# Altium footprint library 3D_MIG_Controller.PCBLIB: 560 footprints (part 28 of 35)
Each footprint in its own frame and in the unit in brackets; x right, y up, seen from the top. Pads: shape width x height; smd on the part's side, far side on the other; paste and mask are expansions set on the pad; w line width, h text height; cw(c..) or ccw(c..) is an arc to the next point about the centre after c.
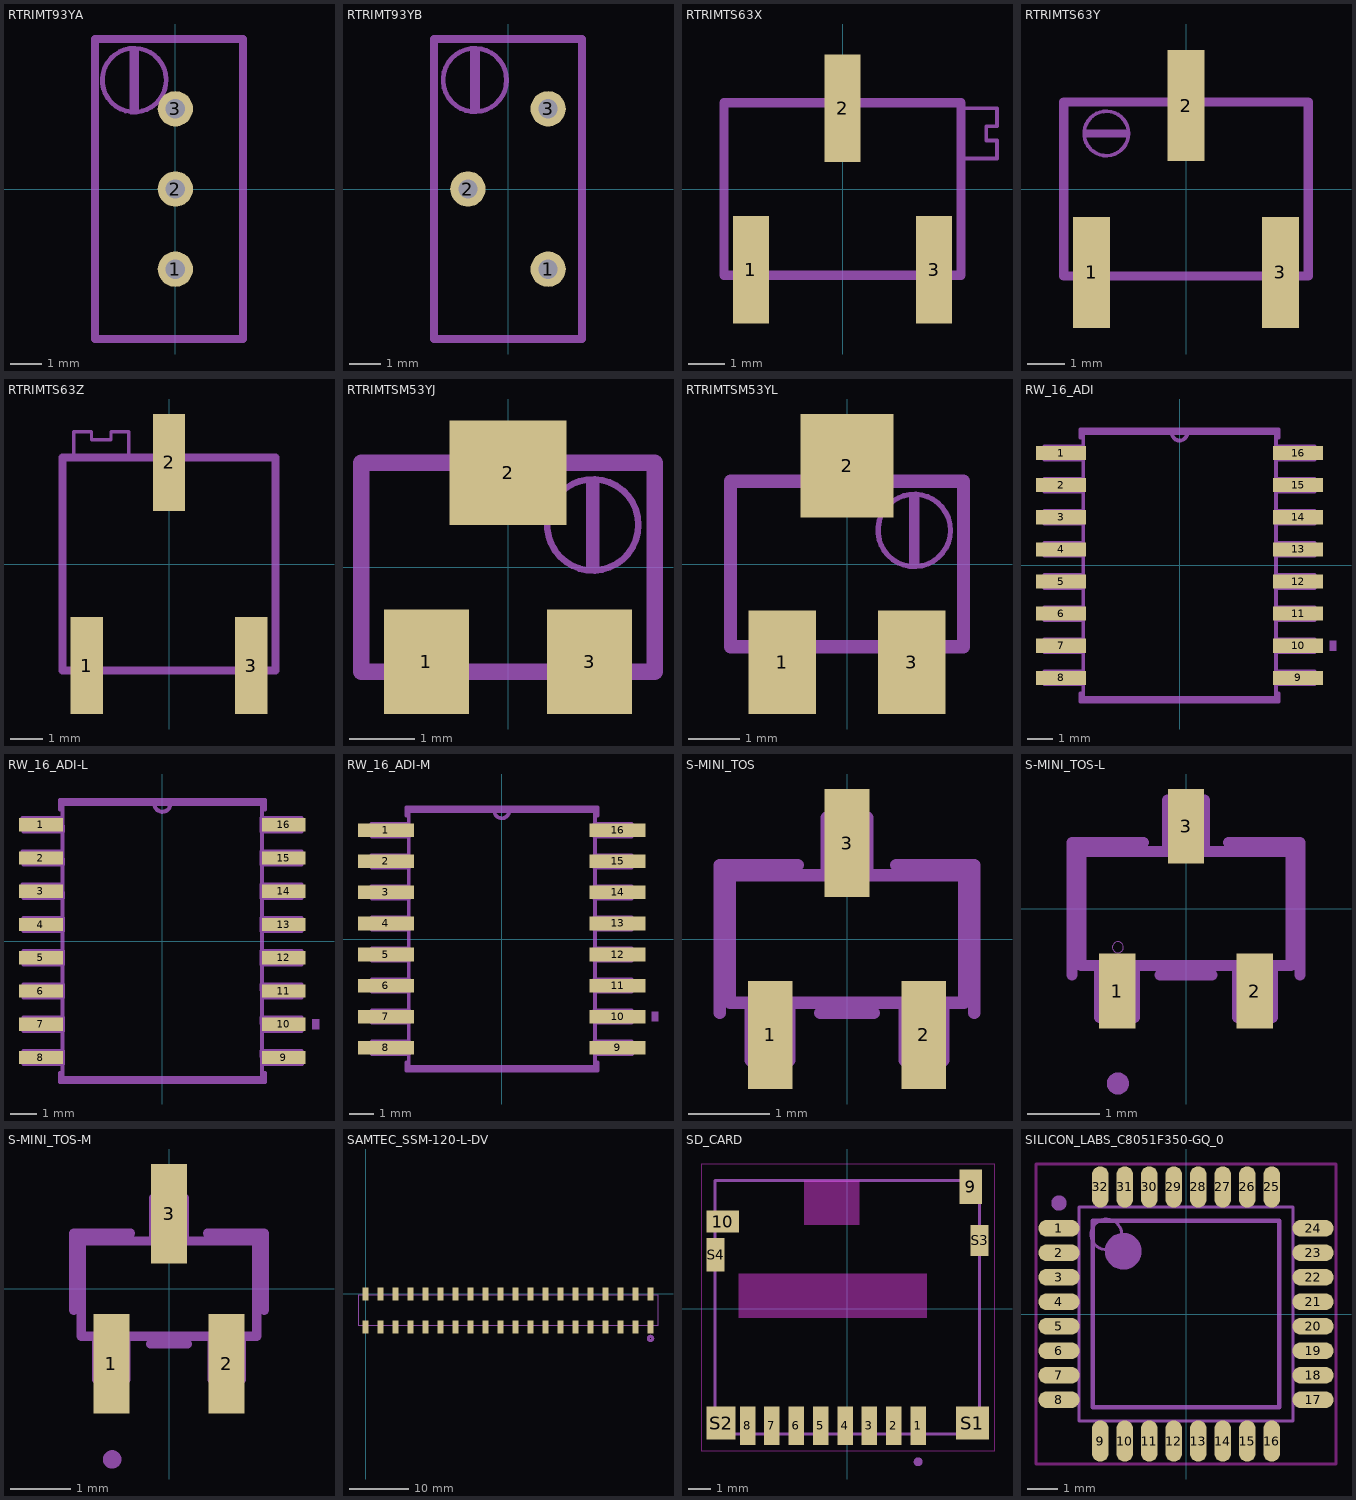
[diagram p27: the footprints below, top view; thin cyan lines are the x and y axes]

## RTRIMT93YA [mil]
pads (3):
  round 44 hole 24: 1(0,-100) 2(0,0) 3(0,100)
tDocu:
  lines w6: -29.53,102.36 ccw(c-51.18,135.76) -11.81,129.92
tPlace:
  region: -57.09,98.43 -57.09,173.23 -45.28,173.23 -45.28,98.43
  lines w6: -29.53,102.36 cw(c-51.18,135.76) -11.81,129.92
  lines w10: -100.39,-187.01 -100.39,187.01 84.65,187.01 84.65,-187.01 -100.39,-187.01

## RTRIMT93YB [mil]
pads (3):
  round 44 hole 24: 1(50,-100) 2(-50,0) 3(50,100)
tPlace:
  circle w6: c-41.34,135.83 r39.56
  region: -47.24,98.43 -47.24,173.23 -35.43,173.23 -35.43,98.43
  lines w10: -92.52,-187.01 -92.52,187.01 92.52,187.01 92.52,-187.01 -92.52,-187.01

## RTRIMTS63X [mm]
pads (3):
  rect 1x3 smd: 1(-2.55,-2.25) 2(0,2.25) 3(2.55,-2.25)
tDocu:
  region: -0.25,2.5 -0.25,3.35 0.25,3.35 0.25,2.5
  region: 2.3,-3.35 2.3,-2.5 2.8,-2.5 2.8,-3.35
  region: -2.8,-3.35 -2.8,-2.5 -2.3,-2.5 -2.3,-3.35
  lines w0.254: -3.3,-2.4 -3.3,2.4 3.3,2.4 3.3,-2.4 -3.3,-2.4
tPlace:
  lines w0.102: 3.4,0.85 4.3,0.85 4.3,1.35 4,1.35 4,1.75 4.3,1.75 4.3,2.25 3.4,2.25
  lines w0.254: -3.3,-2.4 -3.3,2.4 -0.8,2.4 ; -1.75,-2.4 1.75,-2.4 ; 0.8,2.4 3.3,2.4 3.3,-2.4

## RTRIMTS63Y [mm]
pads (3):
  rect 1x3 smd: 1(-2.55,-2.25) 2(0,2.25) 3(2.55,-2.25)
tDocu:
  region: -0.3,2.45 -0.3,3 0.3,3 0.3,2.45
  region: -2.85,-3 -2.85,-2.45 -2.25,-2.45 -2.25,-3
  region: 2.25,-3 2.25,-2.45 2.85,-2.45 2.85,-3
  lines w0.254: -3.3,-2.35 -3.3,2.35 3.3,2.35 3.3,-2.35 -3.3,-2.35
tPlace:
  circle w0.102: c-2.15,1.5 r0.6
  region: -2.7,1.4 -2.7,1.6 -1.6,1.6 -1.6,1.4
  lines w0.254: -3.3,-2.35 -3.3,2.35 -0.75,2.35 ; -1.75,-2.35 1.75,-2.35 ; 0.75,2.35 3.3,2.35 3.3,-2.35

## RTRIMTS63Z [mm]
pads (3):
  rect 1x3 smd: 1(-2.55,-3.15) 2(0,3.15) 3(2.55,-3.15)
tDocu:
  region: -0.3,3.4 -0.3,4.4 0.3,4.4 0.3,3.4
  region: -2.85,-4.4 -2.85,-3.4 -2.25,-3.4 -2.25,-4.4
  region: 2.25,-4.4 2.25,-3.4 2.85,-3.4 2.85,-4.4
  lines w0.254: -3.3,-3.3 -3.3,3.3 3.3,3.3 3.3,-3.3 -3.3,-3.3
tPlace:
  lines w0.102: -2.95,3.45 -2.95,4.1 -2.4,4.1 -2.4,3.85 -1.8,3.85 -1.8,4.1 -1.25,4.1 -1.25,3.4
  lines w0.254: -3.3,-3.3 -3.3,3.3 -0.75,3.3 ; -1.75,-3.3 1.75,-3.3 ; 0.75,3.3 3.3,3.3 3.3,-3.3

## RTRIMTSM53YJ [mil]
pads (3):
  rect 51.18x62.99 smd: 1(-49.21,-57.09) 3(49.21,-57.09)
  rect 70.87x62.99 smd: 2(0,57.09)
tDocu:
  circle w4: c51.18,25.59 r27.56
  region: -11.81,66.93 -11.81,74.8 11.81,74.8 11.81,66.93
  region: -62.99,-74.8 -62.99,-66.93 -39.37,-66.93 -39.37,-74.8
  region: 37.4,-74.8 37.4,-66.93 61.02,-66.93 61.02,-74.8
  lines w10: -88.58,-62.99 -88.58,62.99 88.58,62.99 88.58,-62.99 -88.58,-62.99
tPlace:
  region: 47.24,0 47.24,51.18 55.12,51.18 55.12,0
  lines w10: -88.58,-62.99 -88.58,62.99 -45.28,62.99 ; -15.75,-62.99 15.75,-62.99 ; 45.28,62.99 88.58,62.99 88.58,-62.99

## RTRIMTSM53YL [mm]
pads (3):
  rect 1.3x2 smd: 1(-1.25,-1.9) 3(1.25,-1.9)
  rect 1.8x2 smd: 2(0,1.9)
tDocu:
  circle w0.102: c1.3,0.65 r0.7
  region: -0.3,1.7 -0.3,2.55 0.3,2.55 0.3,1.7
  region: -1.55,-2.55 -1.55,-1.7 -0.95,-1.7 -0.95,-2.55
  region: 0.95,-2.55 0.95,-1.7 1.55,-1.7 1.55,-2.55
  lines w0.254: -2.25,-1.6 -2.25,1.6 2.25,1.6 2.25,-1.6 -2.25,-1.6
tPlace:
  region: 1.2,0 1.2,1.3 1.4,1.3 1.4,0
  lines w0.254: -2.25,-1.6 -2.25,1.6 -1.15,1.6 ; -0.35,-1.6 0.35,-1.6 ; 1.15,1.6 2.25,1.6 2.25,-1.6

## RW_16_ADI [mil]
pads (16):
  rect 78x22 smd: 1(-184.5,175) 2(-184.5,125) 3(-184.5,75) 4(-184.5,25) 5(-184.5,-25) 6(-184.5,-75) 7(-184.5,-125) 8(-184.5,-175) 9(184.5,-175) 10(184.5,-125) 11(184.5,-75) 12(184.5,-25) 13(184.5,25) 14(184.5,75) 15(184.5,125) 16(184.5,175)
tDocu:
  lines w6: 12,207 cw(c0,206.5) -12,206 ; -12,206 150,206 150,-206 -150,-206 -150,206 -12,206 ; -210,-185 -210,-165 -150,-165 -150,-185 -210,-185 ; -210,-135 -210,-115 -150,-115 -150,-135 -210,-135 ; -210,-85 -210,-65 -150,-65 -150,-85 -210,-85 ; -210,-35 -210,-15 -150,-15 -150,-35 -210,-35 ; -210,15 -210,35 -150,35 -150,15 -210,15 ; -210,65 -210,85 -150,85 -150,65 -210,65 ; -210,115 -210,135 -150,135 -150,115 -210,115 ; -210,165 -210,185 -150,185 -150,165 -210,165 ; 150,-185 150,-165 210,-165 210,-185 150,-185 ; 150,-135 150,-115 210,-115 210,-135 150,-135 ; 150,-85 150,-65 210,-65 210,-85 150,-85 ; 150,-35 150,-15 210,-15 210,-35 150,-35 ; 150,15 150,35 210,35 210,15 150,15 ; 150,65 150,85 210,85 210,65 150,65 ; 150,115 150,135 210,135 210,115 150,115 ; 150,165 150,185 210,185 210,165 150,165
  text "*" at -157,154 h77.5
tPlace:
  region: 243.5,-117.5 243.5,-132.5 233.5,-132.5 233.5,-117.5
  lines w6: -154,-199 -154,-212 154,-212 154,-199 ; -154,199 -154,212 154,212 154,199
  text "*" at -217,192 h77.5

## RW_16_ADI-L [mil]
pads (16):
  rect 66x20 smd: 1(-182.5,175) 2(-182.5,125) 3(-182.5,75) 4(-182.5,25) 5(-182.5,-25) 6(-182.5,-75) 7(-182.5,-125) 8(-182.5,-175) 9(182.5,-175) 10(182.5,-125) 11(182.5,-75) 12(182.5,-25) 13(182.5,25) 14(182.5,75) 15(182.5,125) 16(182.5,175)
tDocu:
  lines w6: 12,207 cw(c0,206.5) -12,206 ; -12,206 150,206 150,-206 -150,-206 -150,206 -12,206 ; -210,85 -150,85 -149,65 -209,65 -210,85 ; -210,135 -150,135 -149,115 -209,115 -210,135 ; -210,185 -150,185 -149,165 -209,165 -210,185 ; -209,-185 -209,-165 -149,-165 -149,-185 -209,-185 ; -209,-135 -209,-115 -149,-115 -149,-135 -209,-135 ; -209,-85 -209,-65 -149,-65 -149,-85 -209,-85 ; -209,-35 -209,-15 -149,-15 -149,-35 -209,-35 ; -209,15 -209,35 -149,35 -149,15 -209,15 ; 149,-165 150,-185 210,-185 209,-165 149,-165 ; 149,-115 150,-135 209,-135 209,-115 149,-115 ; 149,-65 150,-85 209,-85 209,-65 149,-65 ; 149,-35 149,-15 209,-15 209,-35 149,-35 ; 149,15 149,35 209,35 209,15 149,15 ; 149,65 149,85 209,85 209,65 149,65 ; 149,115 149,135 209,135 209,115 149,115 ; 149,165 149,185 209,185 209,165 149,165
  text "*" at -157,154 h77.5
tPlace:
  region: 235.5,-117.5 235.5,-132.5 225.5,-132.5 225.5,-117.5
  lines w6: -154,-198 -154,-212 154,-212 154,-198 ; -154,198 -154,212 154,212 154,198
  text "*" at -215,190 h77.5

## RW_16_ADI-M [mil]
pads (16):
  rect 90x22 smd: 1(-186.5,175) 2(-186.5,125) 3(-186.5,75) 4(-186.5,25) 5(-186.5,-25) 6(-186.5,-75) 7(-186.5,-125) 8(-186.5,-175) 9(186.5,-175) 10(186.5,-125) 11(186.5,-75) 12(186.5,-25) 13(186.5,25) 14(186.5,75) 15(186.5,125) 16(186.5,175)
tDocu:
  lines w6: 12,207 cw(c0,206.5) -12,206 ; -12,206 150,206 150,-206 -150,-206 -150,206 -12,206 ; -210,85 -150,85 -149,65 -209,65 -210,85 ; -210,135 -150,135 -149,115 -209,115 -210,135 ; -210,185 -150,185 -149,165 -209,165 -210,185 ; -209,-185 -209,-165 -149,-165 -149,-185 -209,-185 ; -209,-135 -209,-115 -149,-115 -149,-135 -209,-135 ; -209,-85 -209,-65 -149,-65 -149,-85 -209,-85 ; -209,-35 -209,-15 -149,-15 -149,-35 -209,-35 ; -209,15 -209,35 -149,35 -149,15 -209,15 ; 149,-165 150,-185 210,-185 209,-165 149,-165 ; 149,-115 150,-135 209,-135 209,-115 149,-115 ; 149,-65 150,-85 209,-85 209,-65 149,-65 ; 149,-35 149,-15 209,-15 209,-35 149,-35 ; 149,15 149,35 209,35 209,15 149,15 ; 149,65 149,85 209,85 209,65 149,65 ; 149,115 149,135 209,135 209,115 149,115 ; 149,165 149,185 209,185 209,165 149,165
  text "*" at -157,154 h77.5
tPlace:
  region: 251.5,-117.5 251.5,-132.5 241.5,-132.5 241.5,-117.5
  lines w6: -154,-199 -154,-212 154,-212 154,-199 ; -154,199 -154,212 154,212 154,199
  text "*" at -219,192 h77.5

## S-MINI_TOS [mil]
pads (3):
  rect 21.69x52.61 smd: 1(-37.4,-46.75) 2(37.4,-46.75) 3(0,46.75)
tDocu:
  lines w6: -57,-31 57,-31 57,31 -57,31 -57,-31 ; -47,-59 -47,-31 -28,-31 -28,-59 -47,-59 ; -10,31 10,31 10,59 -10,59 -10,31 ; 28,-59 28,-31 47,-31 47,-59 28,-59
tPlace:
  lines w6: -62,-36 -62,36 -24,36 ; -13,-36 13,-36 ; 24,36 62,36 62,-36

## S-MINI_TOS-L [mil]
pads (3):
  rect 19.69x40.61 smd: 1(-37.4,-44.75) 2(37.4,-44.75) 3(0,44.75)
tDocu:
  lines w0: -40,-21 ccw(c-37,-21) -34,-21 ccw(c-37,-21) -40,-21
  lines w6: -57,-31 57,-31 57,31 -57,31 -57,-31 ; -47,-59 -47,-31 -28,-31 -28,-59 -47,-59 ; -10,31 10,31 10,59 -10,59 -10,31 ; 28,-59 28,-31 47,-31 47,-59 28,-59
tPlace:
  lines w6: -62,-36 -62,36 -23,36 ; -14,-36 14,-36 ; 23,36 62,36 62,-36 ; -40,-95 ccw(c-37,-95) -34,-95 ccw(c-37,-95) -40,-95

## S-MINI_TOS-M [mil]
pads (3):
  rect 23.69x64.61 smd: 1(-37.4,-48.75) 2(37.4,-48.75) 3(0,48.75)
tDocu:
  lines w0: -40,-21 ccw(c-37,-21) -34,-21 ccw(c-37,-21) -40,-21
  lines w6: -57,-31 57,-31 57,31 -57,31 -57,-31 ; -47,-59 -47,-31 -28,-31 -28,-59 -47,-59 ; -10,31 10,31 10,59 -10,59 -10,31 ; 28,-59 28,-31 47,-31 47,-59 28,-59
tPlace:
  lines w6: -62,-14 -62,36 -25,36 ; -12,-36 12,-36 ; 25,36 62,36 62,-14 ; -40,-111 ccw(c-37,-111) -34,-111 ccw(c-37,-111) -40,-111

## SAMTEC_SSM-120-L-DV [mil]
pads (40):
  rect 40x87 smd: 1(1900,-222) 2(1900,0) 3(1800,-222) 4(1800,0) 5(1700,-222) 6(1700,0) 7(1600,-222) 8(1600,0) 9(1500,-222) 10(1500,0) 11(1400,-222) 12(1400,0) 13(1300,-222) 14(1300,0) 15(1200,-222) 16(1200,0) 17(1100,-222) 18(1100,0) 19(1000,-222) 20(1000,0) 21(900,-222) 22(900,0) 23(800,-222) 24(800,0) 25(700,-222) 26(700,0) 27(600,-222) 28(600,0) 29(500,-222) 30(500,0) 31(400,-222) 32(400,0) 33(300,-222) 34(300,0) 35(200,-222) 36(200,0) 37(100,-222) 38(100,0) 39(0,-222) 40(0,0)
tDocu:
  lines w6: -50,-211 1950,-211 1950,-11 -50,-11 -50,-211
  lines w20: 1885,-298 ccw(c1900,-298) 1915,-298 ccw(c1900,-298) 1885,-298
tPlace:
  lines w0: 1890,-286 ccw(c1899.77,-297.7) 1915,-298 ccw(c1899.33,-297.49) 1910,-286
  lines w6: -33,-211 -50,-211 -50,-11 -33,-11 ; 33,-211 67,-211 ; 33,-11 67,-11 ; 133,-211 167,-211 ; 133,-11 167,-11 ; 233,-211 267,-211 ; 233,-11 267,-11 ; 333,-211 367,-211 ; 333,-11 367,-11 ; 433,-211 467,-211 ; 433,-11 467,-11 ; 533,-211 567,-211 ; 533,-11 567,-11 ; 633,-211 667,-211 ; 633,-11 667,-11 ; 733,-211 767,-211 ; 733,-11 767,-11 ; 833,-211 867,-211 ; 833,-11 867,-11 ; 933,-211 967,-211 ; 933,-11 967,-11 ; 1033,-211 1067,-211 ; 1033,-11 1067,-11 ; 1133,-211 1167,-211 ; 1133,-11 1167,-11 ; 1233,-211 1267,-211 ; 1233,-11 1267,-11 ; 1333,-211 1367,-211 ; 1333,-11 1367,-11 ; 1433,-211 1467,-211 ; 1433,-11 1467,-11 ; 1533,-211 1567,-211 ; 1533,-11 1567,-11 ; 1633,-211 1667,-211 ; 1633,-11 1667,-11 ; 1733,-211 1767,-211 ; 1733,-11 1767,-11 ; 1833,-211 1867,-211 ; 1833,-11 1867,-11 ; 1933,-211 1950,-211 1950,-11 1933,-11

## SD_CARD [mm]
pads (14):
  rect 0.7x1.75 smd: 1(3.2,-5.285) 2(2.1,-5.285) 3(1,-5.285) 4(-0.1,-5.285) 5(-1.2,-5.285) 6(-2.3,-5.285) 7(-3.4,-5.285) 8(-4.5,-5.285)
  rect 1x1.55 smd: 9(5.575,5.515)
  rect 1.45x1 smd: 10(-5.625,3.94)
  rect 1.5x1.5 smd: S1(5.65,-5.16)
  rect 1.3x1.5 smd: S2(-5.7,-5.16)
  rect 0.8x1.4 smd: S3(5.975,3.09)
  rect 0.8x1.5 smd: S4(-5.95,2.44)
Top keep-out:
  region: -4.9,-0.41 -4.9,1.59 3.6,1.59 3.6,-0.41
  region: -1.95,3.79 -1.95,5.79 0.55,5.79 0.55,3.79
  region: -1.95,3.79 -1.95,5.79 0.55,5.79 0.55,3.79
  region: -4.9,-0.41 -4.9,1.59 3.6,1.59 3.6,-0.41
  lines w0.05: -6.6,-6.41 -6.6,6.54 6.65,6.54 6.65,-6.41 -6.6,-6.41
tDocu:
  circle w0.2: c3.2,-6.91 r0.1
  lines w0.127: -5.975,-5.66 5.975,-5.66 5.975,5.79 -5.975,5.79 -5.975,-5.66
tPlace:
  circle w0.2: c3.2,-6.91 r0.1
  lines w0.127: -5.975,-4.09 -5.975,1.37 ; -5.975,4.76 -5.975,5.79 4.78,5.79 ; 5.975,-4.09 5.975,2.07

## SILICON_LABS_C8051F350-GQ_0 [mm]
pads (32):
  rrect100% 1.35x0.55 smd: 1(-4.15,2.8) 2(-4.15,2) 3(-4.15,1.2) 4(-4.15,0.4) 5(-4.15,-0.4) 6(-4.15,-1.2) 7(-4.15,-2) 8(-4.15,-2.8) 17(4.15,-2.8) 18(4.15,-2) 19(4.15,-1.2) 20(4.15,-0.4) 21(4.15,0.4) 22(4.15,1.2) 23(4.15,2) 24(4.15,2.8)
  rrect100% 0.55x1.35 smd: 9(-2.8,-4.15) 10(-2,-4.15) 11(-1.2,-4.15) 12(-0.4,-4.15) 13(0.4,-4.15) 14(1.2,-4.15) 15(2,-4.15) 16(2.8,-4.15) 25(2.8,4.15) 26(2,4.15) 27(1.2,4.15) 28(0.4,4.15) 29(-0.4,4.15) 30(-1.2,4.15) 31(-2,4.15) 32(-2.8,4.15)
Top keep-out:
  lines w0.1: -4.9,-4.9 -4.9,4.9 4.9,4.9 4.9,-4.9 -4.9,-4.9
tDocu:
  circle w0.1: c-2.6,2.6 r0.5
  lines w0.1: -3.5,-3.5 -3.5,3.5 3.5,3.5 3.5,-3.5 -3.5,-3.5
tPlace:
  circle w0.25: c-4.15,3.625 r0.125
  circle w0.6: c-2.05,2.05 r0.3
  lines w0.15: -3.05,-3.05 -3.05,3.05 3.05,3.05 3.05,-3.05 -3.05,-3.05